# Altium footprint library Miscellaneous SMD.PcbLib: 82 footprints (part 7 of 7)
Each footprint in its own frame and in the unit in brackets; x right, y up, seen from the top. Pads: shape width x height; smd on the part's side, far side on the other; paste and mask are expansions set on the pad; w line width, h text height; cw(c..) or ccw(c..) is an arc to the next point about the centre after c.
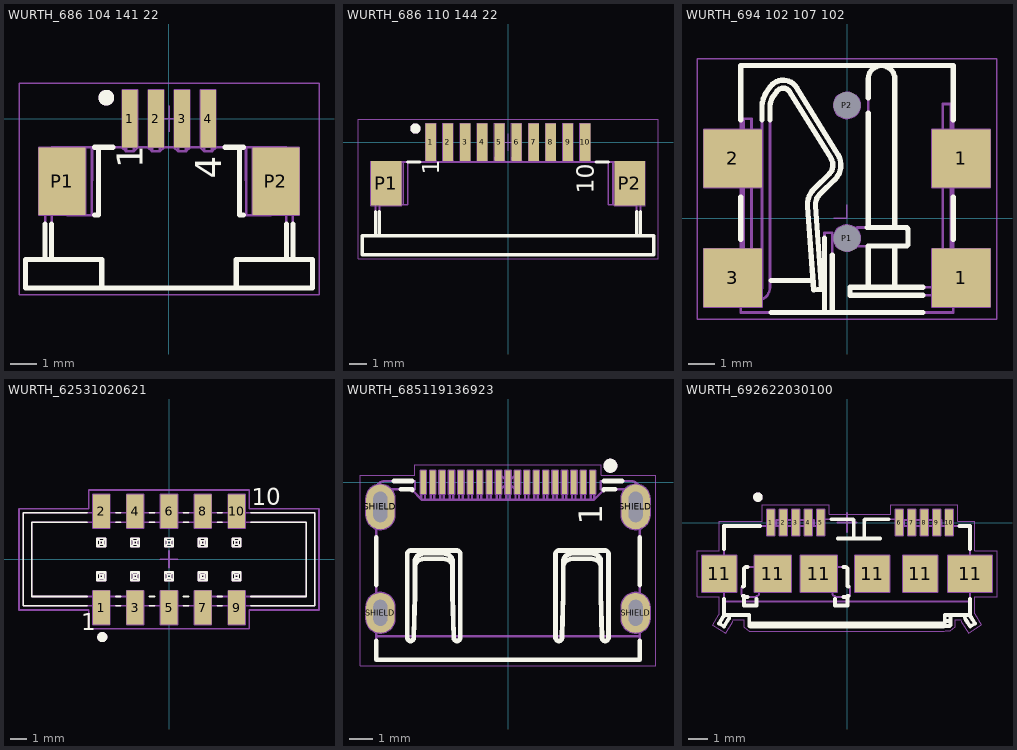
[diagram p6: the footprints below, top view; thin cyan lines are the x and y axes]

## WURTH_686 104 141 22 [mm] "4 Contacts, Pitch 1mm, SMT Connector, ZIF Horizontal Top Contact WR-FPC"
height 3.1
pads (6):
  rect 0.6x2.2 smd: 1(-1.5,0) 2(-0.5,0) 3(0.5,0) 4(1.5,0)
  rect 1.8x2.6 smd: P1(-4.1,-2.4) P2(4.1,-2.4)
Top Overlay:
  circle w0.3: c-2.4,0.8 r0.15
  lines w0.2: -4.75,-5.4 -4.75,-4.05 ; -4.5,-5.4 -4.5,-4.05 ; -2.85,-3.7 -2.7,-3.7 -2.7,-1.1 ; -2.85,-1.1 -2.15,-1.1 ; -2.575,-6.5 -2.575,-5.4 -5.5,-5.4 -5.5,-6.5 5.5,-6.5 5.5,-5.4 2.575,-5.4 2.575,-6.5 ; 2.15,-1.1 2.85,-1.1 ; 2.7,-1.1 2.7,-3.7 2.85,-3.7 ; 4.5,-5.4 4.5,-4.05 ; 4.75,-5.4 4.75,-4.05
  text "1" at -1,-1.9 h1
  text "4" at 2,-2.3 h1
Mechanical 8:
  lines w0.05: -4.6,-2.4 -4.1,-2.4 ; -4.1,-2.9 -4.1,-2.4 ; -4.1,-1.9 -4.1,-2.4 ; -3.6,-2.4 -4.1,-2.4 ; 0,-0.5 0,0 ; 0,0.5 0,0 ; 3.6,-2.4 4.1,-2.4 ; 4.1,-2.9 4.1,-2.4 ; 4.1,-1.9 4.1,-2.4 ; 4.6,-2.4 4.1,-2.4 ; -1.8,-1.1 -1.2,-1.1 ; -1.8,-1.1 -1.8,1.1 -1.2,1.1 -1.2,-1.1 ; -1.8,-1.1 -1.5,0 -1.2,-1.1 ; -0.8,-1.1 -0.2,-1.1 ; -0.8,-1.1 -0.8,1.1 -0.2,1.1 -0.2,-1.1 ; -0.8,-1.1 -0.5,0 ; -0.5,0 -0.2,-1.1 ; -0.5,0 0,0 ; 0,0 0.5,0 ; 0.2,-1.1 0.8,-1.1 ; 0.2,-1.1 0.2,1.1 0.8,1.1 0.8,-1.1 ; 0.2,-1.1 0.5,0 ; 0.5,0 0.8,-1.1 ; 1.2,-1.1 1.8,-1.1 ; 1.2,-1.1 1.2,1.1 1.8,1.1 1.8,-1.1 ; 1.2,-1.1 1.5,0 1.8,-1.1 ; -5,-3.7 -5,-1.1 -3.2,-1.1 -3.2,-3.7 -5,-3.7 ; 3.2,-3.7 3.2,-1.1 5,-1.1 5,-3.7 3.2,-3.7
Mechanical 14:
  circle w0.3: c-2.4,0.8 r0.15
  lines w0.1: -4.75,-5.4 -4.75,-1.7 -4.5,-1.7 ; -4.5,-5.4 -4.5,-1.1 -1.802,-1.1 -1.65,-1.252 ; -3.9,-1.1 -3.9,-3.7 -2.7,-3.7 -2.7,-1.1 ; -2.96,-3.7 -2.95,-1.1 ; -2.575,-6.5 -2.575,-5.4 -5.5,-5.4 -5.5,-6.5 5.5,-6.5 5.5,-5.4 2.575,-5.4 2.575,-6.5 ; 2.7,-1.1 2.7,-3.7 3.9,-3.7 3.9,-1.1 ; 2.95,-1.1 2.96,-3.7 ; 4.5,-5.4 4.5,-1.1 1.802,-1.1 1.65,-1.252 ; 4.5,-1.7 4.75,-1.7 4.75,-5.4 ; -1.65,-1.252 -1.65,0.6 -1.35,0.6 -1.35,-1.252 ; -1.65,-1.252 -1.35,-1.252 ; -1.35,-1.252 -1.198,-1.1 -0.802,-1.1 -0.65,-1.252 ; -0.65,-1.252 -0.65,0.6 -0.35,0.6 -0.35,-1.252 ; -0.65,-1.252 -0.35,-1.252 ; -0.35,-1.252 -0.198,-1.1 0.198,-1.1 0.35,-1.252 ; 0.35,-1.252 0.35,0.6 0.65,0.6 0.65,-1.252 ; 0.35,-1.252 0.65,-1.252 ; 0.65,-1.252 0.802,-1.1 1.198,-1.1 1.35,-1.252 ; 1.35,-1.252 1.35,0.6 1.65,0.6 1.65,-1.252 ; 1.35,-1.252 1.65,-1.252
Mechanical 15:
  lines w0.05: -5.75,-6.75 -5.75,1.35 5.75,1.35 5.75,-6.75 -5.75,-6.75
3D body "WURTH_686 104 141 22.stp": height 3, standoff 0, extent -5.5,-6.5 5.5,0.6

## WURTH_686 110 144 22 [mm] "10 Contacts, Pitch 1mm, SMT Connector, ZIF Horizontal Bottom Contact WR-FPC"
height 3.15
pads (12):
  rect 0.6x2.2 smd: 1(-4.5,0) 2(-3.5,0) 3(-2.5,0) 4(-1.5,0) 5(-0.5,0) 6(0.5,0) 7(1.5,0) 8(2.5,0) 9(3.5,0) 10(4.5,0)
  rect 1.8x2.6 smd: P1(-7.1,-2.4) P2(7.1,-2.4)
Top Overlay:
  circle w0.3: c-5.4,0.8 r0.15
  lines w0.2: -7.73,-5.45 -7.73,-4.05 ; -7.5,-5.45 -7.499,-4.05 ; -5.85,-1.15 -5.15,-1.15 ; 5.15,-1.15 5.85,-1.15 ; 7.499,-4.05 7.5,-5.45 ; 7.73,-5.45 7.73,-4.05 ; -8.5,-6.55 -8.5,-5.45 8.5,-5.45 8.5,-6.55 -8.5,-6.55
  text "10" at 5,-3 h1
  text "1" at -4,-1.9 h1
Mechanical 8:
  lines w0.05: -7.6,-2.4 -7.1,-2.4 ; -7.1,-2.9 -7.1,-2.4 ; -7.1,-1.9 -7.1,-2.4 ; -6.6,-2.4 -7.1,-2.4 ; 0,-0.5 0,0 ; 0,0.5 0,0 ; 6.6,-2.4 7.1,-2.4 ; 7.1,-2.9 7.1,-2.4 ; 7.1,-1.9 7.1,-2.4 ; 7.6,-2.4 7.1,-2.4 ; -4.8,-1.1 -4.5,0 -4.2,-1.1 ; -4.8,-1.1 -4.8,1.1 -4.2,1.1 -4.2,-1.1 ; -4.8,-1.1 -4.2,-1.1 ; -3.8,-1.1 -3.5,0 -3.2,-1.1 ; -3.8,-1.1 -3.8,1.1 -3.2,1.1 -3.2,-1.1 ; -3.8,-1.1 -3.2,-1.1 ; -2.8,-1.1 -2.5,0 -2.2,-1.1 ; -2.8,-1.1 -2.8,1.1 -2.2,1.1 -2.2,-1.1 ; -2.8,-1.1 -2.2,-1.1 ; -1.8,-1.1 -1.5,0 -1.2,-1.1 ; -1.8,-1.1 -1.8,1.1 -1.2,1.1 -1.2,-1.1 ; -1.8,-1.1 -1.2,-1.1 ; -0.8,-1.1 -0.5,0 ; -0.8,-1.1 -0.8,1.1 -0.2,1.1 -0.2,-1.1 ; -0.8,-1.1 -0.2,-1.1 ; -0.5,0 0,0 ; -0.5,0 -0.2,-1.1 ; 0,0 0.5,0 ; 0.2,-1.1 0.5,0 ; 0.2,-1.1 0.2,1.1 0.8,1.1 0.8,-1.1 ; 0.2,-1.1 0.8,-1.1 ; 0.5,0 0.8,-1.1 ; 1.2,-1.1 1.5,0 1.8,-1.1 ; 1.2,-1.1 1.2,1.1 1.8,1.1 1.8,-1.1 ; 1.2,-1.1 1.8,-1.1 ; 2.2,-1.1 2.5,0 2.8,-1.1 ; 2.2,-1.1 2.2,1.1 2.8,1.1 2.8,-1.1 ; 2.2,-1.1 2.8,-1.1 ; 3.2,-1.1 3.5,0 3.8,-1.1 ; 3.2,-1.1 3.2,1.1 3.8,1.1 3.8,-1.1 ; 3.2,-1.1 3.8,-1.1 ; 4.2,-1.1 4.5,0 4.8,-1.1 ; 4.2,-1.1 4.2,1.1 4.8,1.1 4.8,-1.1 ; 4.2,-1.1 4.8,-1.1 ; -8,-3.7 -6.2,-3.7 -6.2,-1.1 -8,-1.1 -8,-3.7 ; 6.2,-3.7 8,-3.7 8,-1.1 6.2,-1.1 6.2,-3.7
Mechanical 14:
  circle w0.3: c-5.4,0.8 r0.15
  lines w0.1: -7.73,-5.45 -7.73,-1.75 -7.5,-1.75 ; -7.5,-5.45 -7.498,-1.15 7.498,-1.15 7.5,-5.45 ; -7.498,-3.65 -5.85,-3.65 -5.85,-1.15 ; -6.11,-3.65 -6.11,-1.15 ; -4.625,-1.15 -4.625,0.55 -4.375,0.55 -4.375,-1.15 ; -3.625,-1.15 -3.625,0.55 -3.375,0.55 -3.375,-1.15 ; -2.625,-1.15 -2.625,0.55 -2.375,0.55 -2.375,-1.15 ; -1.625,-1.15 -1.625,0.55 -1.375,0.55 -1.375,-1.15 ; -0.625,-1.15 -0.625,0.55 -0.375,0.55 -0.375,-1.15 ; 0.375,-1.15 0.375,0.55 0.625,0.55 0.625,-1.15 ; 1.375,-1.15 1.375,0.55 1.625,0.55 1.625,-1.15 ; 2.375,-1.15 2.375,0.55 2.625,0.55 2.625,-1.15 ; 3.375,-1.15 3.375,0.55 3.625,0.55 3.625,-1.15 ; 4.375,-1.15 4.375,0.55 4.625,0.55 4.625,-1.15 ; 5.85,-1.15 5.85,-3.65 7.498,-3.65 ; 6.11,-3.65 6.11,-1.15 ; 7.498,-1.75 7.73,-1.75 7.73,-5.45 ; -8.5,-6.55 -8.5,-5.45 8.5,-5.45 8.5,-6.55 -8.5,-6.55
Mechanical 15:
  lines w0.05: -8.75,-6.8 8.75,-6.8 8.75,1.35 -8.75,1.35 -8.75,-6.8
3D body "WURTH_686 110 144 22.stp": height 3, standoff -0.01, extent -8.5,-6.55 8.5,0.55

## WURTH_694 102 107 102 [mm] "18V/5A, Inside Contact Diameter 1mm, SMT DC Power Socket With Break Contact, Right Angled"
height 5.5
pads (6):
  rect 2.2x2.2 smd: 1(4.3,-2.25) 1(4.3,2.25) 2(-4.3,2.25) 3(-4.3,-2.25)
  round 0.5 hole 1 unplated mask+0.25: P1(0,-0.75) P2(0,4.25)
Top Overlay:
  lines w0.2: -4,-0.8 -4,0.8 ; -4,3.7 -4,5.75 4,5.75 4,3.7 ; -3.2,3.7 -3.2,4.2 cw(c-2.2,4.2) -3.008,4.789 -2.89,4.951 cw(c-2.405,4.597) -1.895,4.912 -0.344,2.398 cw(c-0.995,1.997) -0.461,1.451 -1.021,0.904 ccw(c-0.629,0.503) -1.189,0.462 -0.959,-2.681 -1.258,-2.703 -1.488,0.44 cw(c-0.629,0.503) -1.23,1.119 -0.671,1.665 ccw(c-0.995,1.997) -0.6,2.241 -2.15,4.755 ; -2.9,3.7 -2.9,4.2 cw(c-2.2,4.2) -2.766,4.612 -2.648,4.774 cw(c-2.405,4.597) -2.147,4.75 ; -2.85,-3.55 2.85,-3.55 ; -2.85,-2.35 -1.284,-2.35 ; -0.983,-2.35 -0.85,-2.35 ; -0.85,-3.55 -0.85,-0.75 ; -0.55,-3.55 -0.55,-1.398 ; 0.75,-0.35 2.2,-0.35 cw(c2.2,-0.45) 2.3,-0.45 2.3,-0.95 cw(c2.2,-0.95) 2.2,-1.05 0.795,-1.05 ; 0.8,-2.6 0.8,-1.05 ; 0.8,-0.35 0.8,3.963 ; 0.8,4.537 0.8,5.25 cw(c1.3,5.25) 1.8,5.25 1.8,-0.35 ; 1.8,-2.6 1.8,-1.05 ; 2.85,-2.9 0.11,-2.9 0.11,-2.6 2.85,-2.6 ; 4,-0.8 4,0.8
Mechanical 8:
  circle w0.05: c0,4.25 r0.5
  circle w0.05: c0,-0.75 r0.5
  lines w0.05: -4.8,-2.25 -4.3,-2.25 ; -4.8,2.25 -4.3,2.25 ; -4.3,-2.75 -4.3,-2.25 ; -4.3,-1.75 -4.3,-2.25 ; -4.3,1.75 -4.3,2.25 ; -4.3,2.75 -4.3,2.25 ; -3.8,-2.25 -4.3,-2.25 ; -3.8,2.25 -4.3,2.25 ; -0.5,-0.75 0,-0.75 ; -0.5,0 0,0 0,0.5 ; -0.5,4.25 0,4.25 ; 0,-1.25 0,-0.75 ; 0,-0.25 0,-0.75 ; 0,3.75 0,4.25 ; 0,4.75 0,4.25 ; 0.5,-0.75 0,-0.75 ; 0.5,4.25 0,4.25 ; 3.8,-2.25 4.3,-2.25 ; 3.8,2.25 4.3,2.25 ; 4.3,-2.75 4.3,-2.25 ; 4.3,-1.75 4.3,-2.25 ; 4.3,1.75 4.3,2.25 ; 4.3,2.75 4.3,2.25 ; 4.8,-2.25 4.3,-2.25 ; 4.8,2.25 4.3,2.25 ; -5.4,-3.35 -5.4,-1.15 -3.2,-1.15 -3.2,-3.35 -5.4,-3.35 ; -5.4,1.15 -5.4,3.35 -3.2,3.35 -3.2,1.15 -5.4,1.15 ; 3.2,-3.35 3.2,-1.15 5.4,-1.15 5.4,-3.35 3.2,-3.35 ; 3.2,1.15 3.2,3.35 5.4,3.35 5.4,1.15 3.2,1.15
Mechanical 14:
  lines w0.1: -4,-3.099 ccw(c-4.148,-3.297) -4.148,-3.05 -4.8,-3.05 cw(c-4.8,-2.95) -4.9,-2.95 -4.9,-2.842 cw(c-4.8,-2.842) -4.817,-2.743 ccw(c-4.9,-2.25) -4.817,-1.757 cw(c-4.8,-1.658) -4.9,-1.658 -4.9,-1.55 cw(c-4.8,-1.55) -4.8,-1.45 -4.148,-1.45 cw(c-4.148,-1.697) -4,-1.499 ; -4,1.45 -4.8,1.45 cw(c-4.8,1.55) -4.9,1.55 -4.9,1.658 cw(c-4.8,1.658) -4.817,1.757 ccw(c-4.9,2.25) -4.817,2.743 cw(c-4.8,2.842) -4.9,2.842 -4.9,2.95 cw(c-4.8,2.95) -4.8,3.05 -4,3.05 ; -3.6,-2.35 -3.2,-2.35 ; -2.9,-2.35 -1.284,-2.35 ; -2.15,4.755 -0.6,2.241 cw(c-0.995,1.997) -0.671,1.665 -1.23,1.119 ccw(c-0.629,0.503) -1.488,0.44 -1.258,-2.703 -0.959,-2.681 -1.189,0.462 cw(c-0.629,0.503) -1.021,0.904 -0.461,1.451 ccw(c-0.995,1.997) -0.344,2.398 -1.895,4.912 ccw(c-2.405,4.597) -2.89,4.951 -3.008,4.789 ccw(c-2.2,4.2) -3.2,4.2 -3.2,-2.6 cw(c-3.4,-2.6) -3.6,-2.6 -3.6,3.75 -3.9,3.75 -3.9,-2.6 ccw(c-3.4,-2.6) -2.9,-2.6 -2.9,4.2 cw(c-2.2,4.2) -2.766,4.612 -2.648,4.774 cw(c-2.405,4.597) -2.147,4.75 ; -0.983,-2.35 -0.85,-2.35 ; -0.85,-3.55 -0.85,-0.55 -0.55,-0.55 -0.55,-3.55 ; 0.8,-2.6 0.8,-1.05 ; 0.8,-0.35 0.8,5.25 cw(c1.3,5.25) 1.8,5.25 1.8,-0.35 ; 1.8,-2.6 1.8,-1.05 ; 4,-3.05 4.8,-3.05 ccw(c4.8,-2.95) 4.9,-2.95 4.9,-2.842 ccw(c4.8,-2.842) 4.817,-2.743 cw(c4.9,-2.25) 4.817,-1.757 ccw(c4.8,-1.658) 4.9,-1.658 4.9,-1.55 ccw(c4.8,-1.55) 4.8,-1.45 4,-1.45 ; 4,1.45 4.8,1.45 ccw(c4.8,1.55) 4.9,1.55 4.9,1.658 ccw(c4.8,1.658) 4.817,1.757 cw(c4.9,2.25) 4.817,2.743 ccw(c4.8,2.842) 4.9,2.842 4.9,2.95 ccw(c4.8,2.95) 4.8,3.05 4,3.05 ; -4,-3.55 -4,5.75 4,5.75 4,-3.55 -4,-3.55 ; 0.11,-2.9 3.6,-2.9 ccw(c3.6,-2.59) 3.91,-2.59 3.91,4.3 3.61,4.3 3.61,-2.59 cw(c3.6,-2.59) 3.6,-2.6 0.11,-2.6 0.11,-2.9 ; 0.3,-0.95 ccw(c0.4,-0.95) 0.4,-1.05 2.2,-1.05 ccw(c2.2,-0.95) 2.3,-0.95 2.3,-0.45 ccw(c2.2,-0.45) 2.2,-0.35 0.4,-0.35 ccw(c0.4,-0.45) 0.3,-0.45 0.3,-0.95
Mechanical 15:
  lines w0.05: -5.65,-3.8 5.65,-3.8 5.65,6 -5.65,6 -5.65,-3.8
3D body "WURTH_694 102 107 102.stp": height 5.3, standoff -0.8, extent -4.9,-3.55 4.9,5.75

## WURTH_62531020621 [mm] "10 Contacts, Pitch 2mm, SMT Box Header (WR-BHD Series)"
height 6.8
pads (10):
  rect 1x2 smd: 1(-4,-2.85) 2(-4,2.85) 3(-2,-2.85) 4(-2,2.85) 5(0,-2.85) 6(0,2.85) 7(2,-2.85) 8(2,2.85) 9(4,-2.85) 10(4,2.85)
Top Overlay:
  circle w0.3: c-3.95,-4.6 r0.15
  lines w0.1: -4.85,-2.75 -8.625,-2.75 -8.625,2.75 -4.85,2.75 ; -4.85,-2.2 -8.125,-2.2 -8.125,2.2 -4.85,2.2 ; -3.15,-2.75 -2.85,-2.75 ; -3.15,-2.2 -2.85,-2.2 ; -3.15,2.2 -2.85,2.2 ; -3.15,2.75 -2.85,2.75 ; -1.15,-2.75 -0.85,-2.75 ; -1.15,-2.2 -0.85,-2.2 ; -1.15,2.2 -0.85,2.2 ; -1.15,2.75 -0.85,2.75 ; 0.85,-2.75 1.15,-2.75 ; 0.85,-2.2 1.15,-2.2 ; 0.85,2.2 1.15,2.2 ; 0.85,2.75 1.15,2.75 ; 2.85,-2.75 3.15,-2.75 ; 2.85,-2.2 3.15,-2.2 ; 2.85,2.2 3.15,2.2 ; 2.85,2.75 3.15,2.75 ; 4.85,-2.75 8.625,-2.75 8.625,2.75 4.85,2.75 ; 4.85,-2.2 8.125,-2.2 8.125,2.2 4.85,2.2 ; -4.255,-1.25 -3.755,-1.25 ; -4.255,-1.25 -4.105,-1.1 ; -4.255,-1.25 -4.255,-0.75 ; -4.255,-0.75 -4.105,-0.9 ; -4.255,-0.75 -3.755,-0.75 ; -4.255,0.75 -4.255,1.25 ; -4.255,0.75 -3.755,0.75 ; -4.255,0.75 -4.105,0.9 ; -4.255,1.25 -4.105,1.1 ; -4.255,1.25 -3.755,1.25 ; -4.105,-1.1 -3.905,-1.1 ; -4.105,-1.1 -4.105,-0.9 ; -4.105,-0.9 -3.905,-0.9 ; -4.105,0.9 -3.905,0.9 ; -4.105,0.9 -4.105,1.1 ; -4.105,1.1 -3.905,1.1 ; -3.905,-1.1 -3.755,-1.25 ; -3.905,-1.1 -3.905,-0.9 ; -3.905,-0.9 -3.755,-0.75 ; -3.905,0.9 -3.755,0.75 ; -3.905,0.9 -3.905,1.1 ; -3.905,1.1 -3.755,1.25 ; -3.755,-1.25 -3.755,-0.75 ; -3.755,0.75 -3.755,1.25 ; -2.255,-1.25 -1.755,-1.25 ; -2.255,-1.25 -2.105,-1.1 ; -2.255,-1.25 -2.255,-0.75 ; -2.255,-0.75 -2.105,-0.9 ; -2.255,-0.75 -1.755,-0.75 ; -2.255,0.75 -2.255,1.25 ; -2.255,0.75 -1.755,0.75 ; -2.255,0.75 -2.105,0.9 ; -2.255,1.25 -2.105,1.1 ; -2.255,1.25 -1.755,1.25 ; -2.105,-1.1 -1.905,-1.1 ; -2.105,-1.1 -2.105,-0.9 ; -2.105,-0.9 -1.905,-0.9 ; -2.105,0.9 -1.905,0.9 ; -2.105,0.9 -2.105,1.1 ; -2.105,1.1 -1.905,1.1 ; -1.905,-1.1 -1.755,-1.25 ; -1.905,-1.1 -1.905,-0.9 ; -1.905,-0.9 -1.755,-0.75 ; -1.905,0.9 -1.755,0.75 ; -1.905,0.9 -1.905,1.1 ; -1.905,1.1 -1.755,1.25 ; -1.755,-1.25 -1.755,-0.75 ; -1.755,0.75 -1.755,1.25 ; -0.255,-1.25 0.245,-1.25 ; -0.255,-1.25 -0.105,-1.1 ; -0.255,-1.25 -0.255,-0.75 ; -0.255,-0.75 -0.105,-0.9 ; -0.255,-0.75 0.245,-0.75 ; -0.255,0.75 -0.255,1.25 ; -0.255,0.75 0.245,0.75 ; -0.255,0.75 -0.105,0.9 ; -0.255,1.25 -0.105,1.1 ; -0.255,1.25 0.245,1.25 ; -0.105,-1.1 0.095,-1.1 ; -0.105,-1.1 -0.105,-0.9 ; -0.105,-0.9 0.095,-0.9 ; -0.105,0.9 0.095,0.9 ; -0.105,0.9 -0.105,1.1 ; -0.105,1.1 0.095,1.1 ; 0.095,-1.1 0.245,-1.25 ; 0.095,-1.1 0.095,-0.9 ; 0.095,-0.9 0.245,-0.75 ; 0.095,0.9 0.245,0.75 ; 0.095,0.9 0.095,1.1 ; 0.095,1.1 0.245,1.25 ; 0.245,-1.25 0.245,-0.75 ; 0.245,0.75 0.245,1.25 ; 1.745,-1.25 2.245,-1.25 ; 1.745,-1.25 1.895,-1.1 ; 1.745,-1.25 1.745,-0.75 ; 1.745,-0.75 1.895,-0.9 ; 1.745,-0.75 2.245,-0.75 ; 1.745,0.75 1.745,1.25 ; 1.745,0.75 2.245,0.75 ; 1.745,0.75 1.895,0.9 ; 1.745,1.25 1.895,1.1 ; 1.745,1.25 2.245,1.25 ; 1.895,-1.1 2.095,-1.1 ; 1.895,-1.1 1.895,-0.9 ; 1.895,-0.9 2.095,-0.9 ; 1.895,0.9 2.095,0.9 ; 1.895,0.9 1.895,1.1 ; 1.895,1.1 2.095,1.1 ; 2.095,-1.1 2.245,-1.25 ; 2.095,-1.1 2.095,-0.9 ; 2.095,-0.9 2.245,-0.75 ; 2.095,0.9 2.245,0.75 ; 2.095,0.9 2.095,1.1 ; 2.095,1.1 2.245,1.25 ; 2.245,-1.25 2.245,-0.75 ; 2.245,0.75 2.245,1.25 ; 3.745,-1.25 4.245,-1.25 ; 3.745,-1.25 3.895,-1.1 ; 3.745,-1.25 3.745,-0.75 ; 3.745,-0.75 3.895,-0.9 ; 3.745,-0.75 4.245,-0.75 ; 3.745,0.75 3.745,1.25 ; 3.745,0.75 4.245,0.75 ; 3.745,0.75 3.895,0.9 ; 3.745,1.25 3.895,1.1 ; 3.745,1.25 4.245,1.25 ; 3.895,-1.1 4.095,-1.1 ; 3.895,-1.1 3.895,-0.9 ; 3.895,-0.9 4.095,-0.9 ; 3.895,0.9 4.095,0.9 ; 3.895,0.9 3.895,1.1 ; 3.895,1.1 4.095,1.1 ; 4.095,-1.1 4.245,-1.25 ; 4.095,-1.1 4.095,-0.9 ; 4.095,-0.9 4.245,-0.75 ; 4.095,0.9 4.245,0.75 ; 4.095,0.9 4.095,1.1 ; 4.095,1.1 4.245,1.25 ; 4.245,-1.25 4.245,-0.75 ; 4.245,0.75 4.245,1.25
  text "1" at -5.2,-4.2 h1
  text "10" at 4.9,3.2 h1
Mechanical 8:
  lines w0.1: -4.5,-2.85 -4,-2.85 ; -4.5,2.85 -4,2.85 ; -4,-3.35 -4,-2.85 ; -4,-2.35 -4,-2.85 ; -4,2.35 -4,2.85 ; -4,3.35 -4,2.85 ; -3.5,-2.85 -4,-2.85 ; -3.5,2.85 -4,2.85 ; -2.5,-2.85 -2,-2.85 ; -2.5,2.85 -2,2.85 ; -2,-3.35 -2,-2.85 ; -2,-2.35 -2,-2.85 ; -2,2.35 -2,2.85 ; -2,3.35 -2,2.85 ; -1.5,-2.85 -2,-2.85 ; -1.5,2.85 -2,2.85 ; -0.5,-2.85 0,-2.85 ; -0.5,0 0,0 ; -0.5,2.85 0,2.85 ; 0,-3.35 0,-2.85 ; 0,-2.35 0,-2.85 ; 0,-0.5 0,0 ; 0,0.5 0,0 ; 0,2.35 0,2.85 ; 0,3.35 0,2.85 ; 0.5,-2.85 0,-2.85 ; 0.5,0 0,0 ; 0.5,2.85 0,2.85 ; 1.5,-2.85 2,-2.85 ; 1.5,2.85 2,2.85 ; 2,-3.35 2,-2.85 ; 2,-2.35 2,-2.85 ; 2,2.35 2,2.85 ; 2,3.35 2,2.85 ; 2.5,-2.85 2,-2.85 ; 2.5,2.85 2,2.85 ; 3.5,-2.85 4,-2.85 ; 3.5,2.85 4,2.85 ; 4,-3.35 4,-2.85 ; 4,-2.35 4,-2.85 ; 4,2.35 4,2.85 ; 4,3.35 4,2.85 ; 4.5,-2.85 4,-2.85 ; 4.5,2.85 4,2.85 ; -4.5,-3.85 -3.5,-3.85 -3.5,-1.85 -4.5,-1.85 -4.5,-3.85 ; -4.5,1.85 -4.5,3.85 -3.5,3.85 -3.5,1.85 -4.5,1.85 ; -2.5,-3.85 -1.5,-3.85 -1.5,-1.85 -2.5,-1.85 -2.5,-3.85 ; -2.5,1.85 -2.5,3.85 -1.5,3.85 -1.5,1.85 -2.5,1.85 ; -0.5,-3.85 0.5,-3.85 0.5,-1.85 -0.5,-1.85 -0.5,-3.85 ; -0.5,1.85 -0.5,3.85 0.5,3.85 0.5,1.85 -0.5,1.85 ; 1.5,-3.85 2.5,-3.85 2.5,-1.85 1.5,-1.85 1.5,-3.85 ; 1.5,1.85 1.5,3.85 2.5,3.85 2.5,1.85 1.5,1.85 ; 3.5,-3.85 4.5,-3.85 4.5,-1.85 3.5,-1.85 3.5,-3.85 ; 3.5,1.85 3.5,3.85 4.5,3.85 4.5,1.85 3.5,1.85
Mechanical 14:
  drawing of 192 lines, arcs and shapes, not listed
Mechanical 15:
  lines w0.1: -8.875,-3 -4.75,-3 -4.75,-4.1 4.75,-4.1 4.75,-3 8.875,-3 8.875,3 4.75,3 4.75,4.1 -4.75,4.1 -4.75,3 -8.875,3 -8.875,-3
3D body "WURTH_62531020621.stp": height 7.05, standoff 0, extent -8.625,-3.75 8.625,3.75

## WURTH_685119136923 [mm] "19 Contacts, Pitch 0.4mm, Angled SMT Mini HDMI Connector,"
height 3.3
pads (23):
  rect 0.23x1 smd: 1(3.6,0) 2(3.2,0) 3(2.8,0) 4(2.4,0) 5(2,0) 6(1.6,0) 7(1.2,0) 8(0.8,0) 9(0.4,0) 10(0,0) 11(-0.4,0) 12(-0.8,0) 13(-1.2,0) 14(-1.6,0) 15(-2,0) 16(-2.4,0) 17(-2.8,0) 18(-3.2,0) 19(-3.6,0)
  oval 1.2x1.7 hole 0.6 slot 1.1 at 90 deg: SHIELD(-5.425,-5.55) SHIELD(5.425,-5.55)
  oval 1.2x1.9 hole 0.6 slot 1.3 at 90 deg: SHIELD(-5.425,-1.05) SHIELD(5.425,-1.05)
Top Overlay:
  circle w0.3: c4.35,0.7 r0.15
  lines w0.2: -5.605,-6.733 -5.605,-7.55 5.595,-7.55 5.595,-6.735 ; -5.605,-4.367 -5.605,-2.333 ; -4.842,0.05 -4.065,0.05 ; -4.563,-0.3 -4.105,-0.3 -4.065,-0.34 ; -4.13,-0.3 -4.065,-0.3 ; -4.001,-6.604 cw(c-4.151,-6.6) -4.141,-6.75 cw(c-4.13,-6.6) -4.28,-6.6 -4.28,-3.05 cw(c-4.13,-3.05) -4.13,-2.9 -2.18,-2.9 cw(c-2.18,-3.05) -2.03,-3.05 -2.03,-6.6 cw(c-2.18,-6.6) -2.169,-6.75 cw(c-2.159,-6.6) -2.309,-6.6 ; -4.001,-6.596 -3.955,-4.75 -3.955,-3.313 cw(c-3.558,-3.424) -3.828,-3.113 cw(c-3.443,-3.765) -3.555,-3.016 -2.755,-3.016 ; -3.955,-3.551 cw(c-3.54,-3.654) -3.828,-3.338 cw(c-3.489,-3.925) -3.555,-3.25 -2.755,-3.25 cw(c-2.84,-3.969) -2.485,-3.338 cw(c-2.71,-3.622) -2.355,-3.551 ; -2.754,-3.016 cw(c-2.896,-3.83) -2.485,-3.113 cw(c-2.693,-3.39) -2.355,-3.313 -2.355,-4.75 -2.309,-6.604 ; 2.299,-6.604 cw(c2.149,-6.6) 2.159,-6.75 cw(c2.17,-6.6) 2.02,-6.6 2.02,-3.05 cw(c2.17,-3.05) 2.17,-2.9 4.12,-2.9 cw(c4.12,-3.05) 4.27,-3.05 4.27,-6.6 cw(c4.12,-6.6) 4.131,-6.75 cw(c4.141,-6.6) 3.991,-6.6 ; 2.299,-6.596 2.345,-4.75 2.345,-3.313 cw(c2.742,-3.424) 2.472,-3.113 cw(c2.857,-3.765) 2.745,-3.016 3.545,-3.016 ; 2.345,-3.551 cw(c2.76,-3.654) 2.472,-3.338 cw(c2.811,-3.925) 2.745,-3.25 3.545,-3.25 cw(c3.46,-3.969) 3.815,-3.338 cw(c3.59,-3.622) 3.945,-3.551 ; 3.546,-3.016 cw(c3.404,-3.83) 3.815,-3.113 cw(c3.607,-3.39) 3.945,-3.313 3.945,-4.75 3.991,-6.604 ; 4.065,-0.33 4.095,-0.3 ; 4.065,-0.3 4.095,-0.3 ; 4.065,0.05 4.842,0.05 ; 4.563,-0.3 4.095,-0.3 ; 5.595,-4.365 5.595,-2.335
  text "1" at 4,-1.8 h1
Mechanical 8:
  drawing of 168 lines, arcs and shapes, not listed
Mechanical 14:
  circle w0.3: c4.35,0.7 r0.15
  lines w0.1: -4.13,-0.3 -3.955,-0.3 -3.955,0.05 -5.245,0.05 ccw(c-5.245,-0.31) -5.605,-0.3 ; -4.001,-6.604 cw(c-4.151,-6.6) -4.141,-6.75 cw(c-4.13,-6.6) -4.28,-6.6 -4.28,-3.05 cw(c-4.13,-3.05) -4.13,-2.9 -2.18,-2.9 cw(c-2.18,-3.05) -2.03,-3.05 -2.03,-6.6 cw(c-2.18,-6.6) -2.169,-6.75 cw(c-2.159,-6.6) -2.309,-6.6 ; -4.001,-6.596 -3.955,-4.75 -3.955,-3.313 cw(c-3.558,-3.424) -3.828,-3.113 cw(c-3.443,-3.765) -3.555,-3.016 -2.755,-3.016 ; -3.955,-3.551 cw(c-3.54,-3.654) -3.828,-3.338 cw(c-3.489,-3.925) -3.555,-3.25 -2.755,-3.25 cw(c-2.84,-3.969) -2.485,-3.338 cw(c-2.71,-3.622) -2.355,-3.551 ; -3.68,-0.725 -3.68,0.35 -3.53,0.35 -3.53,-0.75 ; -3.28,-0.75 -3.28,0.352 -3.13,0.352 -3.13,-0.75 ; -2.88,-0.75 -2.88,0.35 -2.73,0.35 -2.73,-0.75 ; -2.754,-3.016 cw(c-2.896,-3.83) -2.485,-3.113 cw(c-2.693,-3.39) -2.355,-3.313 -2.355,-4.75 -2.309,-6.604 ; -2.48,-0.75 -2.48,0.35 -2.33,0.35 -2.33,-0.75 ; -2.08,-0.75 -2.08,0.35 -1.93,0.35 -1.93,-0.75 ; -1.68,-0.75 -1.68,0.35 -1.53,0.35 -1.53,-0.75 ; -1.28,-0.75 -1.28,0.35 -1.13,0.35 -1.13,-0.75 ; -0.88,-0.75 -0.88,0.35 -0.73,0.35 -0.73,-0.75 ; -0.48,-0.75 -0.48,0.35 -0.33,0.35 -0.33,-0.75 ; -0.08,-0.75 -0.08,0.35 0.07,0.35 0.07,-0.75 ; 0.32,-0.75 0.32,0.35 0.47,0.35 0.47,-0.75 ; 0.72,-0.75 0.72,0.35 0.87,0.35 0.87,-0.75 ; 1.12,-0.75 1.12,0.35 1.27,0.35 1.27,-0.75 ; 1.52,-0.75 1.52,0.35 1.67,0.35 1.67,-0.75 ; 1.92,-0.75 1.92,0.35 2.07,0.35 2.07,-0.75 ; 2.299,-6.604 cw(c2.149,-6.6) 2.159,-6.75 cw(c2.17,-6.6) 2.02,-6.6 2.02,-3.05 cw(c2.17,-3.05) 2.17,-2.9 4.12,-2.9 cw(c4.12,-3.05) 4.27,-3.05 4.27,-6.6 cw(c4.12,-6.6) 4.131,-6.75 cw(c4.141,-6.6) 3.991,-6.6 ; 2.299,-6.596 2.345,-4.75 2.345,-3.313 cw(c2.742,-3.424) 2.472,-3.113 cw(c2.857,-3.765) 2.745,-3.016 3.545,-3.016 ; 2.32,-0.75 2.32,0.35 2.47,0.35 2.47,-0.75 ; 2.345,-3.551 cw(c2.76,-3.654) 2.472,-3.338 cw(c2.811,-3.925) 2.745,-3.25 3.545,-3.25 cw(c3.46,-3.969) 3.815,-3.338 cw(c3.59,-3.622) 3.945,-3.551 ; 2.72,-0.75 2.72,0.35 2.87,0.35 2.87,-0.75 ; 3.12,-0.75 3.12,0.35 3.27,0.35 3.27,-0.75 ; 3.52,-0.75 3.52,0.35 3.67,0.35 3.67,-0.725 ; 3.546,-3.016 cw(c3.404,-3.83) 3.815,-3.113 cw(c3.607,-3.39) 3.945,-3.313 3.945,-4.75 3.991,-6.604 ; 5.595,-0.31 ccw(c5.235,-0.31) 5.235,0.05 3.945,0.05 3.945,-0.3 4.095,-0.3 ; -5.605,-0.3 -5.605,-7.55 5.595,-7.55 5.595,-0.3 4.095,-0.3 ; -5.605,-0.3 -4.105,-0.3 -3.655,-0.75 3.645,-0.75 4.095,-0.3
  text "1" at 4,-1.8 h1
Mechanical 15:
  lines w0.05: -6.275,-7.8 6.275,-7.8 6.275,0.3 3.965,0.3 3.965,0.75 -3.965,0.75 -3.965,0.3 -6.275,0.3 -6.275,-7.8
3D body "WURTH_685119136923.stp": height 3.3, standoff -2.15, extent -5.63,-7.55 5.62,0.352

## WURTH_692622030100 [mm] "Horizontal SMD Micro-USB 3.0 Type B"
height 2.85
pads (16):
  rect 0.4x1.35 smd: 1(-3.975,0) 2(-3.325,0) 3(-2.675,0) 4(-2.025,0) 5(-1.375,0) 6(2.725,0) 7(3.375,0) 8(4.025,0) 9(4.675,0) 10(5.325,0)
  rect 1.8x1.9 smd: 11(-6.675,-2.675) 11(1.325,-2.675) 11(3.825,-2.675)
  rect 1.9x1.9 smd: 11(-3.875,-2.675) 11(-1.475,-2.675)
  rect 2.3x1.9 smd: 11(6.425,-2.675)
Top Overlay:
  circle w0.25: c-4.65,1.325 r0.125
  lines w0.2: -6.427,-0.171 -4.525,-0.171 ; -6.425,-3.975 -6.425,-4.825 ; -6.425,-1.375 -6.425,-0.173 ; -6.125,-4.825 cw(c-6.576,-4.824) -6.192,-5.062 -6.415,-5.421 -6.67,-5.264 -6.447,-4.904 ccw(c-6.575,-4.825) -6.425,-4.825 ; -5.425,-3.822 ccw(c-5.4,-3.725) -5.4,-3.825 -5.375,-3.825 -5.375,-4.325 -4.725,-4.325 -4.725,-3.975 ; -5.425,-3.328 cw(c-5.4,-3.425) -5.4,-3.325 -5.375,-3.325 -5.375,-2.425 ; -5.375,-2.422 cw(c-5.275,-2.425) -5.275,-2.325 -5.175,-2.325 ; -5.373,-3.889 -5.175,-3.889 ; -5.1,-5.176 ccw(c-5.006,-5.165) -5,-5.259 5,-5.259 ccw(c4.998,-5.156) 5.1,-5.176 ; -0.825,0.175 0.28,0.175 ; -0.625,-3.975 -0.625,-4.325 0.025,-4.325 0.025,-3.825 0.05,-3.825 ; -0.475,-0.823 1.725,-0.823 ; -0.175,-3.889 0.023,-3.889 ; -0.175,-2.325 -0.075,-2.325 cw(c-0.076,-2.428) 0.027,-2.433 ; 0.025,-2.425 0.025,-3.325 0.05,-3.325 cw(c0.05,-3.425) 0.075,-3.328 ; 0.046,-3.825 ccw(c0.05,-3.725) 0.075,-3.822 ; 0.286,0.175 cw(c0.244,0.077) 0.35,0.075 0.35,-0.823 ; 0.9,-0.823 0.9,0.075 cw(c1.006,0.075) 0.97,0.175 2.175,0.175 ; 5.079,-5.394 5.3,-5.394 ccw(c5.309,-5.303) 5.4,-5.315 5.4,-4.825 ; 5.1,-5.133 5.4,-5.133 ; 5.875,-0.175 6.425,-0.175 6.425,-1.375 ; 6.125,-4.825 ccw(c6.575,-4.825) 6.198,-5.07 6.429,-5.425 6.68,-5.261 6.449,-4.907 cw(c6.575,-4.825) 6.425,-4.825 ; 6.425,-3.975 6.425,-4.825 ; -6.425,-4.825 -5.1,-4.825 -5.1,-5.344 ccw(c-5.008,-5.335) -5,-5.427 5,-5.427 ccw(c5.008,-5.335) 5.1,-5.344 5.1,-4.825 5.4,-4.825 ; 5.4,-4.825 6.425,-4.825
Mechanical 8:
  lines w0.1: -7.175,-2.675 -6.675,-2.675 ; -6.675,-3.175 -6.675,-2.675 ; -6.675,-2.175 -6.675,-2.675 ; -6.425,-4.125 0,-4.125 6.425,-4.125 ; -6.175,-2.675 -6.675,-2.675 ; -4.375,-2.675 -3.875,-2.675 ; -3.875,-3.175 -3.875,-2.675 ; -3.875,-2.175 -3.875,-2.675 ; -3.375,-2.675 -3.875,-2.675 ; -1.975,-2.675 -1.475,-2.675 ; -1.475,-3.175 -1.475,-2.675 ; -1.475,-2.175 -1.475,-2.675 ; -0.975,-2.675 -1.475,-2.675 ; -0.5,0 0,0 ; 0,-0.5 0,0 ; 0,0.5 0,0 ; 0.5,0 0,0 ; 0.825,-2.675 1.325,-2.675 ; 1.325,-3.175 1.325,-2.675 ; 1.325,-2.175 1.325,-2.675 ; 1.825,-2.675 1.325,-2.675 ; 3.325,-2.675 3.825,-2.675 ; 3.825,-3.175 3.825,-2.675 ; 3.825,-2.175 3.825,-2.675 ; 4.325,-2.675 3.825,-2.675 ; 5.925,-2.675 6.425,-2.675 ; 6.425,-3.175 6.425,-2.675 ; 6.425,-2.175 6.425,-2.675 ; 6.925,-2.675 6.425,-2.675 ; -4.175,0.675 -3.975,0 -3.775,0.675 ; -4.175,0.675 -3.775,0.675 ; -4.175,0.675 -4.175,-0.675 -3.775,-0.675 -3.775,0.675 ; -3.525,0.675 -3.325,0 -3.125,0.675 ; -3.525,0.675 -3.125,0.675 ; -3.525,0.675 -3.525,-0.675 -3.125,-0.675 -3.125,0.675 ; -2.875,0.675 -2.675,0 -2.475,0.675 ; -2.875,0.675 -2.475,0.675 ; -2.875,0.675 -2.875,-0.675 -2.475,-0.675 -2.475,0.675 ; -2.225,0.675 -2.025,0 -1.825,0.675 ; -2.225,0.675 -1.825,0.675 ; -2.225,0.675 -2.225,-0.675 -1.825,-0.675 -1.825,0.675 ; -1.575,0.675 -1.375,0 -1.175,0.675 ; -1.575,0.675 -1.175,0.675 ; -1.575,0.675 -1.575,-0.675 -1.175,-0.675 -1.175,0.675 ; 2.525,0.675 2.725,0 2.925,0.675 ; 2.525,0.675 2.925,0.675 ; 2.525,0.675 2.525,-0.675 2.925,-0.675 2.925,0.675 ; 3.175,0.675 3.375,0 3.575,0.675 ; 3.175,0.675 3.575,0.675 ; 3.175,0.675 3.175,-0.675 3.575,-0.675 3.575,0.675 ; 3.825,0.675 4.025,0 4.225,0.675 ; 3.825,0.675 4.225,0.675 ; 3.825,0.675 3.825,-0.675 4.225,-0.675 4.225,0.675 ; 4.475,0.675 4.675,0 4.875,0.675 ; 4.475,0.675 4.875,0.675 ; 4.475,0.675 4.475,-0.675 4.875,-0.675 4.875,0.675 ; 5.125,0.675 5.325,0 5.525,0.675 ; 5.125,0.675 5.525,0.675 ; 5.125,0.675 5.125,-0.675 5.525,-0.675 5.525,0.675 ; -7.575,-3.625 -7.575,-1.725 -5.775,-1.725 -5.775,-3.625 -7.575,-3.625 ; -4.825,-3.625 -4.825,-1.725 -2.925,-1.725 -2.925,-3.625 -4.825,-3.625 ; -2.425,-3.625 -2.425,-1.725 -0.525,-1.725 -0.525,-3.625 -2.425,-3.625 ; 0.425,-3.625 0.425,-1.725 2.225,-1.725 2.225,-3.625 0.425,-3.625 ; 2.925,-3.625 4.725,-3.625 4.725,-1.725 2.925,-1.725 2.925,-3.625 ; 5.275,-3.625 7.575,-3.625 7.575,-1.725 5.275,-1.725 5.275,-3.625
Mechanical 14:
  circle w0.25: c-4.65,1.325 r0.125
  lines w0.1: -6.427,-0.171 -1.575,-0.171 -1.575,0.075 cw(c-1.475,0.075) -1.475,0.175 0.28,0.175 ; -6.425,-3.1 -6.58,-3.125 -6.58,-2.225 -6.425,-2.25 ; -6.425,-0.173 -6.425,-4.825 ; -6.125,-4.825 cw(c-6.576,-4.824) -6.192,-5.062 -6.415,-5.421 -6.67,-5.264 -6.447,-4.904 ccw(c-6.575,-4.825) -6.425,-4.825 ; -5.375,-2.425 -5.375,-3.325 -5.4,-3.325 ccw(c-5.4,-3.425) -5.5,-3.425 -5.5,-3.725 ccw(c-5.4,-3.725) -5.4,-3.825 -5.375,-3.825 -5.375,-4.325 -4.725,-4.325 -4.725,-3.825 -4.7,-3.825 ; -5.375,-2.422 cw(c-5.275,-2.425) -5.275,-2.325 -4.825,-2.325 cw(c-4.826,-2.428) -4.723,-2.433 ; -5.373,-3.889 -4.727,-3.889 ; -5.1,-5.176 ccw(c-5.006,-5.165) -5,-5.259 5,-5.259 ccw(c4.998,-5.156) 5.1,-5.176 ; -4.725,-2.425 -4.725,-3.325 -4.7,-3.325 cw(c-4.7,-3.425) -4.6,-3.425 -4.6,-3.725 cw(c-4.7,-3.725) -4.704,-3.825 ; -4.1,-0.173 -4.1,0.172 -3.85,0.172 -3.85,-0.171 ; -3.675,-0.171 -3.675,0.127 -1.725,0.127 -1.725,-0.175 ; -3.45,0.127 -3.45,0.172 -3.2,0.172 -3.2,0.127 ; -2.8,0.127 -2.8,0.172 -2.55,0.172 -2.55,0.127 ; -2.15,0.127 -2.15,0.172 -1.9,0.172 -1.9,0.127 ; -0.625,-2.425 -0.625,-3.325 -0.65,-3.325 ccw(c-0.65,-3.425) -0.75,-3.425 -0.75,-3.725 ccw(c-0.65,-3.725) -0.65,-3.825 -0.625,-3.825 -0.625,-4.325 0.025,-4.325 0.025,-3.825 0.05,-3.825 ; -0.625,-2.422 cw(c-0.525,-2.425) -0.525,-2.325 -0.075,-2.325 cw(c-0.076,-2.428) 0.027,-2.433 ; -0.623,-3.889 0.023,-3.889 ; -0.475,-0.823 1.725,-0.823 ; 0.025,-2.425 0.025,-3.325 0.05,-3.325 cw(c0.05,-3.425) 0.15,-3.425 0.15,-3.725 cw(c0.05,-3.725) 0.046,-3.825 ; 0.286,0.175 cw(c0.244,0.077) 0.35,0.075 0.35,-0.823 ; 0.9,-0.823 0.9,0.075 cw(c1.006,0.075) 0.97,0.175 2.725,0.175 cw(c2.725,0.075) 2.825,0.075 2.825,-0.173 6.425,-0.175 6.425,-4.825 ; 2.975,-0.173 2.975,0.127 4.925,0.127 4.925,-0.173 ; 3.25,0.127 3.25,0.172 3.5,0.172 3.5,0.127 ; 3.9,0.127 3.9,0.172 4.15,0.172 4.15,0.127 ; 4.55,0.127 4.55,0.172 4.8,0.172 4.8,0.127 ; 5.079,-5.394 5.3,-5.394 ccw(c5.309,-5.303) 5.4,-5.315 5.4,-4.825 ; 5.1,-5.133 5.4,-5.133 ; 5.2,-0.173 5.2,0.172 5.45,0.172 5.45,-0.173 ; 6.125,-4.825 ccw(c6.575,-4.825) 6.198,-5.07 6.429,-5.425 6.68,-5.261 6.449,-4.907 cw(c6.575,-4.825) 6.425,-4.825 ; 6.424,-3.001 7.072,-3.125 7.072,-2.225 6.424,-2.349 ; -6.425,-4.825 -5.1,-4.825 -5.1,-5.344 ccw(c-5.008,-5.335) -5,-5.427 5,-5.427 ccw(c5.008,-5.335) 5.1,-5.344 5.1,-4.825 5.4,-4.825 ; 5.4,-4.825 6.425,-4.825
Mechanical 15:
  lines w0.05: -7.825,-3.875 -6.675,-3.875 -6.675,-4.79 -6.678,-4.802 -7.014,-5.345 -6.334,-5.766 -5.961,-5.164 -5.936,-5.075 -5.35,-5.075 -5.35,-5.455 -5.104,-5.677 5.064,-5.677 5.135,-5.644 5.387,-5.644 5.65,-5.436 5.65,-5.075 5.938,-5.075 5.968,-5.176 6.355,-5.771 7.016,-5.341 6.675,-4.757 6.675,-3.875 7.825,-3.875 7.825,-1.475 6.675,-1.475 6.675,0.075 5.775,0.075 5.775,0.925 2.275,0.925 2.275,0.425 -0.925,0.425 -0.925,0.925 -4.425,0.925 -4.425,0.079 -6.677,0.079 -6.677,-1.475 -7.825,-1.475 -7.825,-3.875
3D body "WURTH_692622030100.stp": height 2.8, standoff -0.15, extent -6.67,-5.427 7.072,0.175